# Altium footprint library Blue Tractor-2021.PcbLib: 82 footprints (part 2 of 6)
Each footprint in its own frame and in the unit in brackets; x right, y up, seen from the top. Pads: shape width x height; smd on the part's side, far side on the other; paste and mask are expansions set on the pad; w line width, h text height; cw(c..) or ccw(c..) is an arc to the next point about the centre after c.
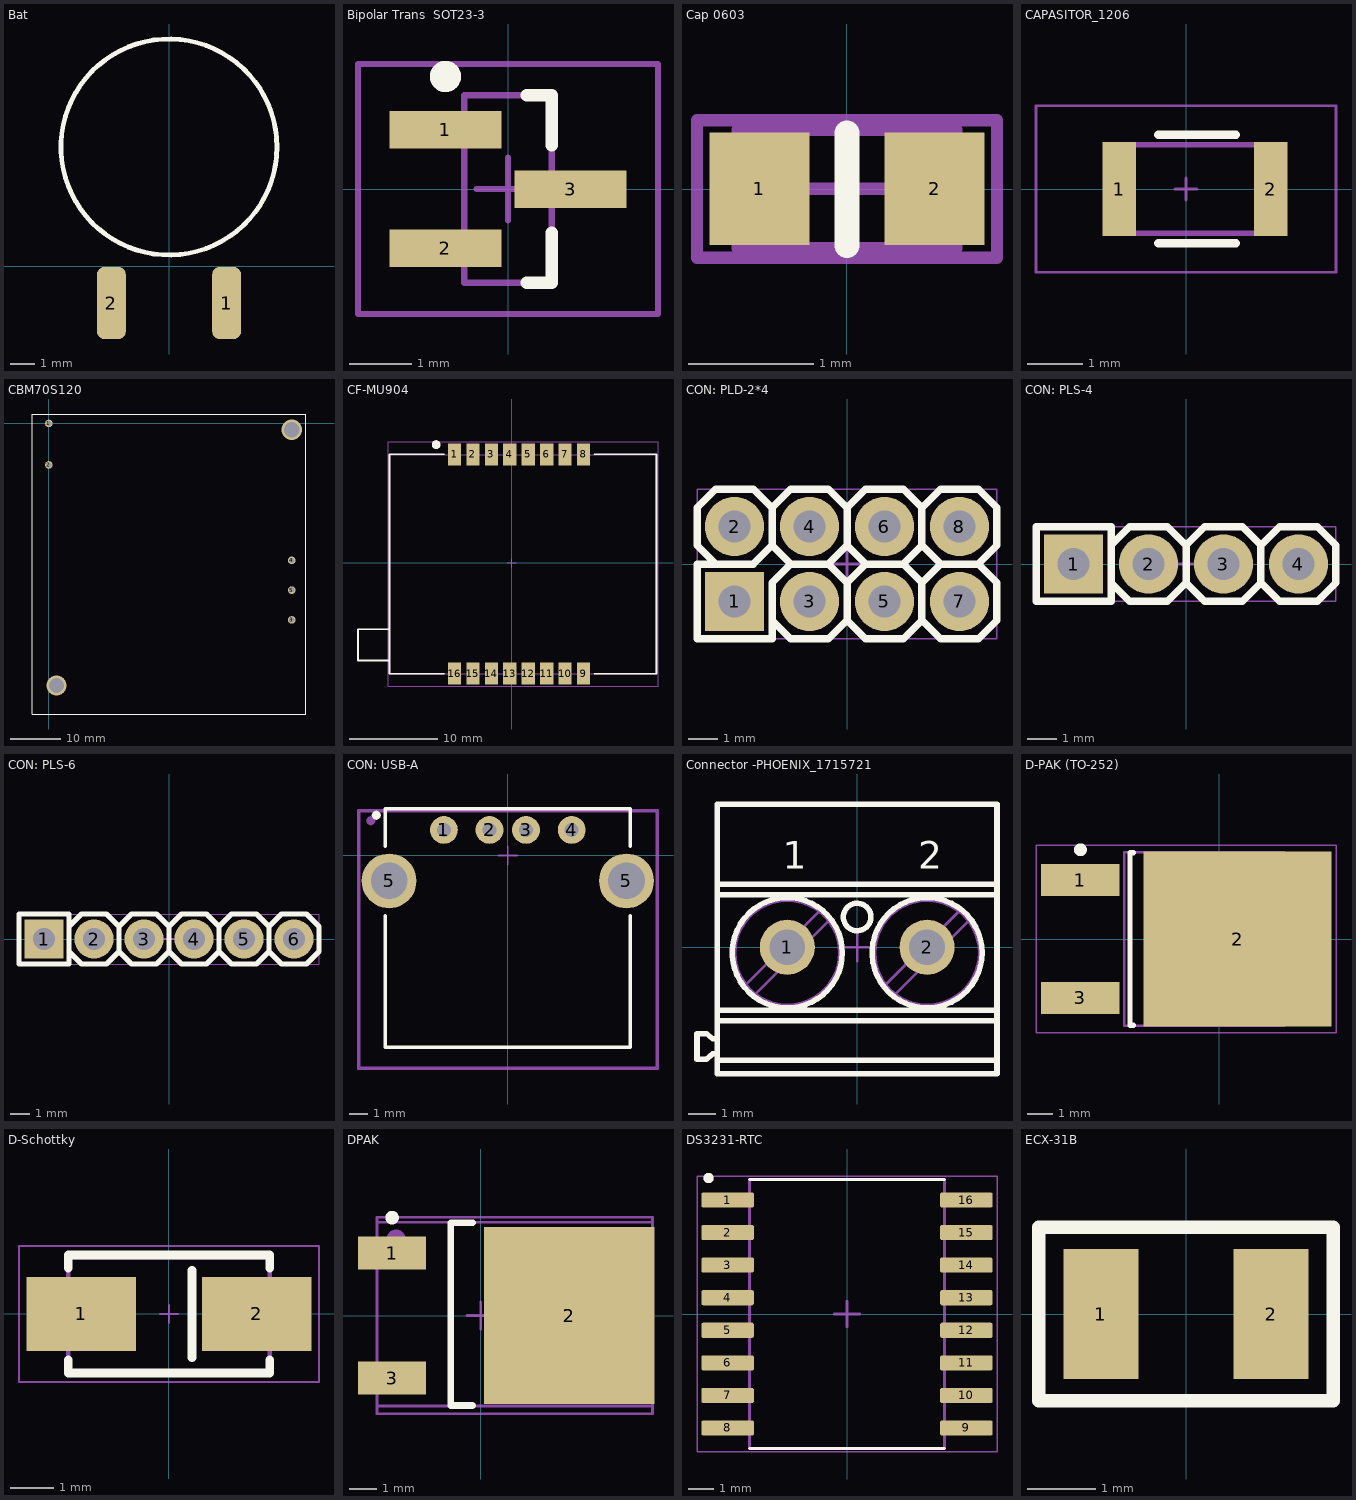
[diagram p1: the footprints below, top view; thin cyan lines are the x and y axes]

## Bat [mm]
pads (2):
  rrect50% 1.2x3 smd: 1(2.4,-1.525) 2(-2.4,-1.525)
Top Overlay:
  circle w0.2: c0,4.975 r4.5
3D body "CR1025 3V Cell.STEP": height 2.5, standoff 0, extent -5,-0.025 5,9.975

## Bipolar Trans  SOT23-3 [mm] "SOT23, 3-Leads, Body 2.9x1.3mm, Pitch 0.95mm, Lead Span 2.5mm, IPC Low Density"
height 1.1
pads (3):
  rect 1.8x0.6 smd: 1(-1,0.95) 2(-1,-0.95) 3(1,0)
Top Overlay:
  circle w0.25: c-1,1.8 r0.125
  lines w0.2: 0.3,-1.5 0.7,-1.5 0.7,-0.7 ; 0.3,1.5 0.7,1.5 0.7,0.7
Mechanical 13:
  lines w0.1: -0.7,-1.5 0.7,-1.5 0.7,1.5 -0.7,1.5 -0.7,-1.5
Mechanical 15:
  lines w0.1: -0.5,0 0.5,0 ; 0,-0.5 0,0.5 ; -2.4,-2 2.4,-2 2.4,2 -2.4,2 -2.4,-2
3D body: height 1.1, standoff 0, extent -0.7,-1.5 0.7,1.5

## Cap 0603 [mm] "Chip Capacitor, Body 1.6x0.8mm, IPC High Density"
height 1.3
pads (2):
  rect 0.8x0.9 smd: 1(-0.7,0) 2(0.7,0)
Top Overlay:
  lines w0.2: 0,-0.45 0,0.45
Mechanical 13:
  lines w0.1: -0.875,-0.475 -0.875,0.475 0.875,0.475 0.875,-0.475 -0.875,-0.475
Mechanical 15:
  lines w0.1: -0.475,0 0.475,0 ; 0,-0.475 0,0.475 ; -1.2,-0.55 -1.2,0.55 1.2,0.55 1.2,-0.55 -1.2,-0.55
3D body "User Library-CAPC1608X_0603.step": height 0.57, standoff 0, extent -0.8,-0.41 0.8,0.41

## CAPASITOR_1206 [mm] "500V"
height 1.2
pads (2):
  rect 0.6x1.7 smd: 1(-1.2,0) 2(1.524,0)
Top Overlay:
  lines w0.152: -0.5,-0.975 0.9,-0.975 ; -0.5,0.975 0.9,0.975
Mechanical 13:
  lines w0.1: -1.3,-0.8 -1.3,0.8 ; 1.3,-0.8 1.3,0.8 ; -1.025,-0.8 1.6,-0.8 1.6,0.8 -1.025,0.8 -1.025,0.375 -1.025,-0.425 -1.025,-0.8
Mechanical 15:
  lines w0.05: -0.2,0 0,0 ; 0,-0.2 0,0.2 ; 0,0 0,0 ; 0,0 0.2,0 ; 0.2,0 0.2,0 ; -2.7,-1.5 -2.7,1.5 2.7,1.5 2.7,-1.5 -2.7,-1.5
3D body: height 1.2, standoff 0, extent -1.299,-0.799 1.299,0.799
3D body: height 1.2, standoff 0, extent 1.301,-0.799 1.599,0.799

## CBM70S120 [mm] "AC-DC"
height 4.5
pads (5):
  round 1.5 hole 1: 1(0,0) 2(0,-8.26) 3(48.3,-39.06) 4(48.3,-27.22) 5(48.3,-33.14)
via 1.5,-52.06 diameter 4 hole 3
via 48.3,-1.26 diameter 4 hole 3
Top Overlay:
  lines w0.1: -0.3,0 0,0 ; 48.275,-27.22 48.3,-27.22 48.325,-27.22
  lines w0.2: -3.3,-57.76 -3.3,1.875 51.1,1.875 51.1,-57.725 ; -3.275,-57.76 51.1,-57.76

## CF-MU904 [mm] "UHF RFID reader module"
height 3.5
pads (16):
  rect 1.5x2.5 smd: 1(-6.509,12.373) 2(-4.409,12.373) 3(-2.309,12.373) 4(-0.209,12.373) 5(1.891,12.373) 6(3.991,12.373) 7(6.091,12.373) 8(8.191,12.373) 9(8.191,-12.627) 10(6.091,-12.627) 11(3.991,-12.627) 12(1.891,-12.627) 13(-0.209,-12.627) 14(-2.309,-12.627) 15(-4.409,-12.627) 16(-6.509,-12.627)
Top Overlay:
  circle w0.5: c-8.6,13.475 r0.251
  lines w0.2: -13.909,-11.127 -17.509,-11.127 -17.509,-7.566 -13.909,-7.566 ; -7.7,-12.627 -13.909,-12.627 -13.909,12.373 -7.7,12.373 ; 9.4,-12.627 16.491,-12.627 16.491,12.373 9.4,12.373
Mechanical 13:
  lines w0.127: -13.925,-12.625 -13.925,12.35 16.475,12.35 16.475,-12.625 -13.925,-12.625
  lines w0.2: -8.385,13.502 cw(c-8.6,13.5) -8.385,13.505
Mechanical 15:
  lines w0.003: -0.026,-0.025 0.025,0.026
  lines w0.05: -14.075,-14.05 -14.075,13.8 16.675,13.8 16.675,-14.05 -14.075,-14.05
  lines w0.1: -0.5,0 0.5,0 ; 0,-0.5 0,0.5
3D body "CF-MU904.STEP": height 3.8, standoff 0, extent -17.85,-12.625 16.65,12.375

## CON: PLD-2*4 [mm] "PLD-40 8 pin header"
height 10
pads (8):
  rect 2x2 hole 1.1: 1(-3.81,-1.27)
  round 2 hole 1.1: 2(-3.81,1.27) 3(-1.27,-1.27) 4(-1.27,1.27) 5(1.27,-1.27) 6(1.27,1.27) 7(3.81,-1.27) 8(3.81,1.27)
Top Overlay:
  lines w0.254: -4.445,0 -5.08,0.635 -5.08,1.905 -4.445,2.54 ; -2.54,-1.905 -1.905,-2.54 -0.635,-2.54 0,-1.905 ; -4.445,2.54 -3.175,2.54 ; -4.445,2.54 -3.175,2.54 ; -3.175,2.54 -2.54,1.905 ; -2.54,0.635 -2.54,1.905 ; -2.54,0.635 -3.175,0 -5.08,0 -5.08,-2.54 -2.54,-2.54 -2.54,-0.635 -1.905,0 ; -2.54,0.635 -1.905,0 ; -2.54,1.905 -1.905,2.54 ; -1.905,0 -0.635,0 ; -1.905,2.54 -0.635,2.54 ; -1.905,2.54 -0.635,2.54 ; -0.635,0 0,-0.635 ; -0.635,0 0,0.635 ; -0.635,2.54 0,1.905 ; 0,-1.905 0,-0.635 ; 0,-1.905 0.635,-2.54 1.905,-2.54 2.54,-1.905 ; 0,-0.635 0.635,0 ; 0,0.635 0.635,0 ; 0,0.635 0,1.905 ; 0,1.905 0.635,2.54 ; 0.635,0 1.905,0 ; 0.635,2.54 1.905,2.54 ; 0.635,2.54 1.905,2.54 ; 1.905,0 2.54,-0.635 ; 1.905,0 2.54,0.635 ; 1.905,2.54 2.54,1.905 ; 2.54,-1.905 2.54,-0.635 ; 2.54,-1.905 3.175,-2.54 4.445,-2.54 5.08,-1.905 5.08,-0.635 4.445,0 ; 2.54,-0.635 3.175,0 ; 2.54,0.635 3.175,0 ; 2.54,0.635 2.54,1.905 ; 2.54,1.905 3.175,2.54 ; 3.175,0 4.445,0 ; 3.175,2.54 4.445,2.54 ; 3.175,2.54 4.445,2.54 ; 4.445,0 5.08,0.635 5.08,1.905 4.445,2.54
Mechanical 13:
  lines w0.1: -4.445,0 -5.08,0.635 -5.08,1.905 -4.445,2.54 -3.175,2.54 -2.54,1.905 -1.905,2.54 -0.635,2.54 0,1.905 ; -2.54,-1.905 -1.905,-2.54 -0.635,-2.54 0,-1.905 ; -1.905,0 -0.635,0 ; -1.905,0 -2.54,0.635 -3.175,0 -5.08,0 -5.08,-2.54 -2.54,-2.54 -2.54,-0.635 -1.905,0 ; -0.635,0 0,0.635 ; -0.635,0 0,-0.635 ; 0,-1.905 0,-0.635 ; 0,-1.905 0.635,-2.54 1.905,-2.54 2.54,-1.905 ; 0,-0.635 0.635,0 ; 0,0.635 0,1.905 ; 0,0.635 0.635,0 ; 0,1.905 0.635,2.54 1.905,2.54 2.54,1.905 ; 0.635,0 1.905,0 ; 1.905,0 2.54,0.635 ; 1.905,0 2.54,-0.635 ; 2.54,-1.905 2.54,-0.635 ; 2.54,-1.905 3.175,-2.54 4.445,-2.54 5.08,-1.905 5.08,-0.635 4.445,0 ; 2.54,-0.635 3.175,0 ; 2.54,0.635 2.54,1.905 ; 2.54,0.635 3.175,0 ; 2.54,1.905 3.175,2.54 4.445,2.54 5.08,1.905 5.08,0.635 4.445,0 ; 3.175,0 4.445,0
Mechanical 15:
  lines w0.05: -5.08,-2.54 5.08,-2.54 5.08,2.54 -5.08,2.54 -5.08,-2.54
  lines w0.1: -0.5,0 0.5,0 ; 0,-0.5 0,0.5
3D body "PLD-8.STEP": height 8.54, standoff -3, extent -5.132,-2.546 5.028,2.534

## CON: PLS-4 [mm] "PLS-40 4 pin header"
height 10
pads (4):
  rect 2x2 hole 1.1: 1(-3.81,0)
  round 2 hole 1.1: 2(-1.27,0) 3(1.27,0) 4(3.81,0)
Top Overlay:
  lines w0.254: -2.54,-0.635 -1.905,-1.27 -0.635,-1.27 0,-0.635 ; -2.54,0.635 -1.905,1.27 -0.635,1.27 0,0.635 ; 0,-0.635 0,0.635 ; 0,-0.635 0.635,-1.27 1.905,-1.27 2.54,-0.635 ; 0,0.635 0.635,1.27 1.905,1.27 2.54,0.635 ; 2.54,-0.635 2.54,0.635 ; 2.54,-0.635 3.175,-1.27 4.445,-1.27 5.08,-0.635 5.08,0.635 4.445,1.27 3.175,1.27 2.54,0.635 ; -5.08,-1.27 -5.08,1.27 -2.54,1.27 -2.54,-1.27 -5.08,-1.27
Mechanical 13:
  lines w0.1: -2.54,-0.635 -1.905,-1.27 -0.635,-1.27 0,-0.635 ; -2.54,0.635 -1.905,1.27 -0.635,1.27 0,0.635 ; 0,-0.635 0,0.635 ; 0,-0.635 0.635,-1.27 1.905,-1.27 2.54,-0.635 ; 0,0.635 0.635,1.27 1.905,1.27 2.54,0.635 ; 2.54,-0.635 2.54,0.635 ; 2.54,-0.635 3.175,-1.27 4.445,-1.27 5.08,-0.635 5.08,0.635 4.445,1.27 3.175,1.27 2.54,0.635 ; -5.08,-1.27 -2.54,-1.27 -2.54,1.27 -5.08,1.27 -5.08,-1.27
Mechanical 15:
  lines w0.05: -5.08,-1.27 5.08,-1.27 5.08,1.27 -5.08,1.27 -5.08,-1.27
  lines w0.1: -0.5,0 0.5,0 ; 0,-0.5 0,0.5
3D body "PLS-4.STEP": height 8.54, standoff -3, extent -5.08,-1.27 5.08,1.27

## CON: PLS-6 [mm]
height 10
pads (6):
  rect 2x2 hole 1.1: 1(-6.35,0)
  round 2 hole 1.1: 2(-3.81,0) 3(-1.27,0) 4(1.27,0) 5(3.81,0) 6(6.35,0)
Top Overlay:
  lines w0.254: -5.08,-0.635 -4.445,-1.27 -3.175,-1.27 -2.54,-0.635 ; -5.08,0.635 -4.445,1.27 -3.175,1.27 -2.54,0.635 ; -2.54,-0.635 -1.905,-1.27 -0.635,-1.27 0,-0.635 ; -2.54,-0.635 -2.54,0.635 ; -2.54,0.635 -1.905,1.27 -0.635,1.27 0,0.635 ; 0,-0.635 0.635,-1.27 1.905,-1.27 2.54,-0.635 ; 0,-0.635 0,0.635 ; 0,0.635 0.635,1.27 1.905,1.27 2.54,0.635 ; 2.54,-0.635 3.175,-1.27 4.445,-1.27 5.08,-0.635 ; 2.54,-0.635 2.54,0.635 ; 2.54,0.635 3.175,1.27 4.445,1.27 5.08,0.635 ; 5.08,-0.635 5.08,0.635 ; 5.08,-0.635 5.715,-1.27 6.985,-1.27 7.62,-0.635 7.62,0.635 6.985,1.27 5.715,1.27 5.08,0.635 ; -7.62,-1.27 -5.08,-1.27 -5.08,1.27 -7.62,1.27 -7.62,-1.27
Mechanical 13:
  lines w0.1: -5.08,-0.635 -4.445,-1.27 -3.175,-1.27 -2.54,-0.635 ; -5.08,0.635 -4.445,1.27 -3.175,1.27 -2.54,0.635 ; -2.54,-0.635 -1.905,-1.27 -0.635,-1.27 0,-0.635 ; -2.54,-0.635 -2.54,0.635 ; -2.54,0.635 -1.905,1.27 -0.635,1.27 0,0.635 ; 0,-0.635 0,0.635 ; 0,-0.635 0.635,-1.27 1.905,-1.27 2.54,-0.635 ; 0,0.635 0.635,1.27 1.905,1.27 2.54,0.635 ; 2.54,-0.635 2.54,0.635 ; 2.54,-0.635 3.175,-1.27 4.445,-1.27 5.08,-0.635 ; 2.54,0.635 3.175,1.27 4.445,1.27 5.08,0.635 ; 5.08,-0.635 5.08,0.635 ; 5.08,-0.635 5.715,-1.27 6.985,-1.27 7.62,-0.635 7.62,0.635 6.985,1.27 5.715,1.27 5.08,0.635 ; -7.62,-1.27 -5.08,-1.27 -5.08,1.27 -7.62,1.27 -7.62,-1.27
Mechanical 15:
  lines w0.05: -7.62,-1.27 -7.62,1.27 7.62,1.27 7.62,-1.27 -7.62,-1.27
  lines w0.1: -0.5,0 0.5,0 ; 0,-0.5 0,0.5
3D body "PLS-6.STEP": height 8.54, standoff -3, extent -7.62,-1.27 7.62,1.27

## CON: USB-A [mm]
height 5
pads (8):
  round 1.524 hole 0.762: 1(-3.5,1.397) 2(-1,1.397) 3(1,1.397) 4(3.5,1.397)
  round 3 hole 2: 5(-6.5,-1.397) 5(6.5,-1.397)
  round 0.5 on Mech13: ""(-7.5,1.9)
  round 0.5 on Top Overlay: ""(-7.2,2.2)
Top Overlay:
  lines w0.2: -6.7,-3.294 -6.7,-10.5 6.7,-10.5 6.7,-3.294 ; -6.7,0.5 -6.7,2.55 6.7,2.55 6.7,0.5
Mechanical 13:
  lines w0.1: -8.105,-11.593 8.129,-11.593 8.129,2.407 -8.105,2.407 -8.105,-11.593
Mechanical 15:
  lines w0.1: -0.5,0 0.5,0 ; 0,-0.5 0,0.5 ; -8.2,-11.7 -8.2,2.5 8.225,2.5 8.225,-11.7 -8.2,-11.7
3D body "USB_A_PCB.STEP": height 7.66, standoff -3.62, extent -8.105,-11.593 8.129,2.407

## Connector -PHOENIX_1715721 [mm] "Terminal Block, 17.5A 400V, Pitch 5.08mm, 2 Positions, Screw Connection"
height 13.8
pads (2):
  round 2 hole 1.3: 1(-2.54,0) 2(2.54,0)
Top Overlay:
  circle w0.2: c2.54,-0.2 r2
  circle w0.2: c-2.54,-0.2 r2
  circle w0.2: c0,1.1 r0.5
  lines w0.2: -5.08,-4.1 5.08,-4.1 ; -5.08,-3.869 -5.247,-3.869 -5.479,-4.064 -5.821,-4.064 -5.821,-3.136 -5.479,-3.136 -5.247,-3.331 -5.08,-3.331 ; -5.08,-2.672 5.08,-2.672 ; -5.08,-2.283 5.08,-2.283 ; -5.08,1.909 5.08,1.909 ; -5.08,2.29 5.08,2.29 ; -5.08,-4.6 -5.08,5.2 5.08,5.2 5.08,-4.6 -5.08,-4.6
  text "2" at 2.222,2.857 h1
  text "1" at -2.699,2.857 h1
Mechanical 8:
  lines w0.1: -3.04,0 -2.54,0 ; -2.54,-0.5 -2.54,0 ; -2.54,0.5 -2.54,0 ; -2.04,0 -2.54,0 ; -0.5,0 0,0 ; 0,-0.5 0,0 ; 0,0.5 0,0 ; 0.5,0 0,0 ; 2.04,0 2.54,0 ; 2.54,-0.5 2.54,0 ; 2.54,0.5 2.54,0 ; 3.04,0 2.54,0
Mechanical 14:
  circle w0.1: c-2.54,-0.2 r1.891
  circle w0.1: c2.54,-0.2 r1.891
  circle w0.1: c0,1.1 r0.5
  circle w0.1: c-2.54,-0.2 r2
  circle w0.1: c2.54,-0.2 r2
  lines w0.1: -5.08,-4.1 5.08,-4.1 ; -5.08,-3.869 -5.247,-3.869 -5.479,-4.064 -5.821,-4.064 -5.821,-3.136 -5.479,-3.136 -5.247,-3.331 -5.08,-3.331 ; -5.08,-2.672 5.08,-2.672 ; -5.08,-2.283 5.08,-2.283 ; -5.08,1.909 5.08,1.909 ; -5.08,2.29 5.08,2.29 ; -4.043,-1.349 -1.391,1.303 ; -3.689,-1.703 -1.037,0.949 ; 1.037,-1.349 3.689,1.303 ; 1.391,-1.703 4.043,0.949 ; -5.08,-4.6 5.08,-4.6 5.08,5.2 -5.08,5.2 -5.08,-4.6
  text "2" at 2.222,2.857 h1
  text "1" at -2.699,2.857 h1
3D body "PHOENIX_1715721.stp": height 14.2, standoff -3.5, extent -5.821,-4.6 5.08,5.2

## D-PAK (TO-252) [mm]
pads (3):
  rect 3.05x1.25 smd: 1(-5.4,2.29) 3(-5.4,-2.29)
  rect 7.3x6.8 smd: 2(0.7,0)
Top Overlay:
  circle w0.25: c-5.4,3.465 r0.125
  lines w0.2: -3.35,-3.35 -3.475,-3.35 -3.475,3.35 -3.35,3.35
Mechanical 13:
  lines w0.1: -3.7,-3.375 2.52,-3.375 2.52,3.375 -3.7,3.375 -3.7,-3.375
Mechanical 15:
  lines w0.05: -7.125,-3.65 4.525,-3.65 4.525,3.65 -7.125,3.65 -7.125,-3.65
  lines w0.1: -1.8,0 -0.8,0 ; -1.3,-0.5 -1.3,0.5
3D body "User Library-DPAK_TO-252AA.step": height 2.37, standoff -0.03, extent -6.382,-3.367 3.718,3.367

## D-Schottky [mm] "40 V 3 A"
pads (2):
  rect 2.5x1.7 smd: 1(-2,0) 2(2,0)
Top Overlay:
  lines w0.2: -2.3,-1.05 -2.3,-1.35 2.3,-1.35 2.3,-1.05 ; -2.3,1.05 -2.3,1.35 2.3,1.35 2.3,1.05 ; 0.525,-1 0.525,1
Mechanical 13:
  lines w0.1: -2.3,-1.35 -2.3,1.3 2.3,1.3 2.3,-1.325 -2.3,-1.325 ; -2.3,-0.7 -2.6,-0.7 -2.6,0.7 -2.3,0.7 ; 2.3,-0.7 2.6,-0.7 2.6,0.7 2.3,0.7
Mechanical 15:
  lines w0.05: -0.2,0 0.2,0 ; 0,-0.2 0,0.2 ; -3.425,-1.55 -3.425,1.55 3.425,1.55 3.425,-1.55 -3.425,-1.55
3D body: height 2.5, standoff 0, extent -2.299,-1.275 2.299,1.35
3D body: height 1, standoff 0, extent 2.301,-0.699 2.599,0.699
3D body: height 1, standoff 0, extent -2.599,-0.699 -2.301,0.699

## DPAK [mm] "D-Pak, Body 6,2x6,7mm"
height 2.4
pads (3):
  rect 2.5x1.2 smd: 1(-3.25,2.29) 3(-3.25,-2.29)
  rect 6.25x6.5 smd: 2(3.25,0)
Top Overlay:
  circle w0.25: c-3.25,3.59 r0.125
  lines w0.25: -0.3,-3.3 -1.1,-3.3 -1.1,3.4 -0.3,3.4
Mechanical 13:
  circle w0.5: c-3.1,2.8 r0.1
  lines w0.1: -3.798,-3.317 -3.798,-3.317 ; -3.798,-3.317 -3.798,3.417 6.302,3.417 ; -3.798,-3.317 6.302,-3.317 6.302,3.417 ; 6.302,3.417 6.302,3.417
Mechanical 15:
  lines w0.1: -0.5,0 0.5,0 ; 0,-0.5 0,0.5 ; -3.8,-3.6 -3.8,3.6 6.3,3.6 6.3,-3.6 -3.8,-3.6
3D body "User Library-DPAK_TO-252AA.STEP": height 2.37, standoff -0.03, extent -3.798,-3.317 6.302,3.417

## DS3231-RTC [mm] "SOIC127P1032X265-16N"
pads (16):
  rrect25% 2.05x0.59 smd: 1(-4.655,4.445) 2(-4.655,3.175) 3(-4.655,1.905) 4(-4.655,0.635) 5(-4.655,-0.635) 6(-4.655,-1.905) 7(-4.655,-3.175) 8(-4.655,-4.445) 9(4.655,-4.445) 10(4.655,-3.175) 11(4.655,-1.905) 12(4.655,-0.635) 13(4.655,0.635) 14(4.655,1.905) 15(4.655,3.175) 16(4.655,4.445)
Top Overlay:
  circle w0.2: c-5.4,5.3 r0.1
  lines w0.127: -3.8,-5.25 3.8,-5.25 ; -3.8,5.25 3.8,5.25
Mechanical 3:
  lines w0.1: -0.5,0 0.5,0 ; 0,-0.5 0,0.5
Mechanical 13:
  circle w0.2: c-5.4,5.3 r0.1
  lines w0.127: -3.8,-5.25 -3.8,5.25 3.8,5.25 3.8,-5.25 -3.8,-5.25
Mechanical 15:
  lines w0.05: -5.85,-5.375 -5.85,5.375 5.85,5.375 5.85,-5.375 -5.85,-5.375
3D body "DS3231M+TRL.STEP": height 2.65, standoff 0, extent -5.162,-5.125 5.163,5.175

## ECX-31B [mm] "SMD CRYSTAL 32768Hz"
height 1.5
pads (2):
  rect 1.1x1.9 smd: 1(-1.25,0) 2(1.25,0)
Top Overlay:
  lines w0.2: -2.159,-1.27 2.159,-1.27 2.159,1.27 -2.159,1.27 -2.159,-1.27
3D body "User Library-FX135A-327.step": height 0.9, standoff -0.01, extent -1.6,-0.75 1.6,0.75